# Altium footprint library ST封装.PcbLib: 1336 footprints (part 86 of 109)
Each footprint in its own frame and in the unit in brackets; x right, y up, seen from the top. Pads: shape width x height; smd on the part's side, far side on the other; paste and mask are expansions set on the pad; w line width, h text height; cw(c..) or ccw(c..) is an arc to the next point about the centre after c.
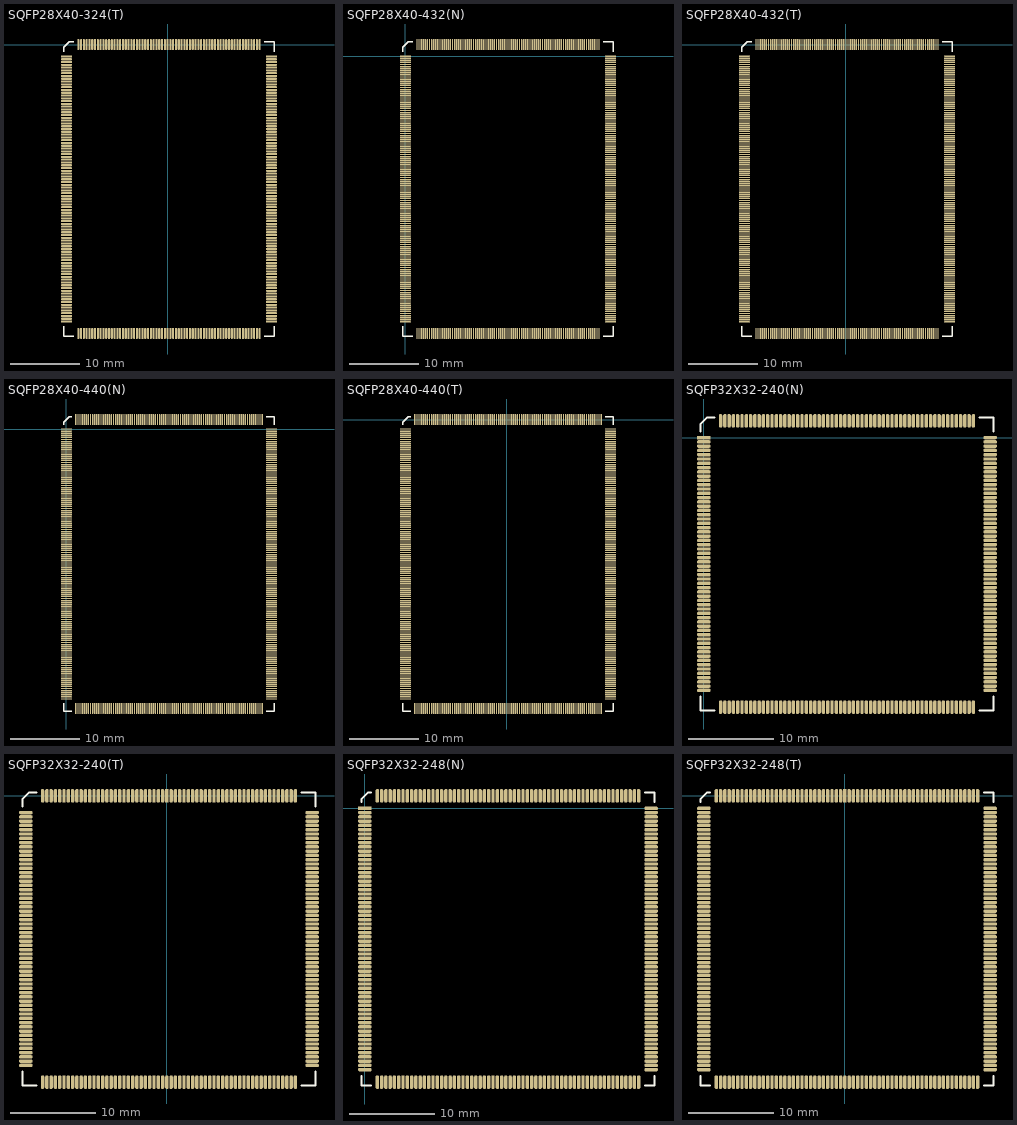
[diagram p85: the footprints below, top view; thin cyan lines are the x and y axes]

## SQFP28X40-324(T) [mm]
pads (324):
  rect 0.3x1.6 smd: 1(0,0)
  oval 0.3x1.6 smd: 2(-0.4,0) 3(-0.8,0) 4(-1.2,0) 5(-1.6,0) 6(-2,0) 7(-2.4,0) 8(-2.8,0) 9(-3.2,0) 10(-3.6,0) 11(-4,0) 12(-4.4,0) 13(-4.8,0) 14(-5.2,0) 15(-5.6,0) 16(-6,0) 17(-6.4,0) 18(-6.8,0) 19(-7.2,0) 20(-7.6,0) 21(-8,0) 22(-8.4,0) 23(-8.8,0) 24(-9.2,0) 25(-9.6,0) 26(-10,0) 27(-10.4,0) 28(-10.8,0) 29(-11.2,0) 30(-11.6,0) 31(-12,0) 32(-12.4,0) 33(-12.8,0) 130(-12.8,-41.4) 131(-12.4,-41.4) 132(-12,-41.4) 133(-11.6,-41.4) 134(-11.2,-41.4) 135(-10.8,-41.4) 136(-10.4,-41.4) 137(-10,-41.4) 138(-9.6,-41.4) 139(-9.2,-41.4) 140(-8.8,-41.4) 141(-8.4,-41.4) 142(-8,-41.4) 143(-7.6,-41.4) 144(-7.2,-41.4) 145(-6.8,-41.4) 146(-6.4,-41.4) 147(-6,-41.4) 148(-5.6,-41.4) 149(-5.2,-41.4) 150(-4.8,-41.4) 151(-4.4,-41.4) 152(-4,-41.4) 153(-3.6,-41.4) 154(-3.2,-41.4) 155(-2.8,-41.4) 156(-2.4,-41.4) 157(-2,-41.4) 158(-1.6,-41.4) 159(-1.2,-41.4) 160(-0.8,-41.4) 161(-0.4,-41.4) 162(0,-41.4) 163(0.4,-41.4) 164(0.8,-41.4) 165(1.2,-41.4) 166(1.6,-41.4) 167(2,-41.4) 168(2.4,-41.4) 169(2.8,-41.4) 170(3.2,-41.4) 171(3.6,-41.4) 172(4,-41.4) 173(4.4,-41.4) 174(4.8,-41.4) 175(5.2,-41.4) 176(5.6,-41.4) 177(6,-41.4) 178(6.4,-41.4) 179(6.8,-41.4) 180(7.2,-41.4) 181(7.6,-41.4) 182(8,-41.4) 183(8.4,-41.4) 184(8.8,-41.4) 185(9.2,-41.4) 186(9.6,-41.4) 187(10,-41.4) 188(10.4,-41.4) 189(10.8,-41.4) 190(11.2,-41.4) 191(11.6,-41.4) 192(12,-41.4) 193(12.4,-41.4) 194(12.8,-41.4) 195(13.2,-41.4) 292(13.2,0) 293(12.8,0) 294(12.4,0) 295(12,0) 296(11.6,0) 297(11.2,0) 298(10.8,0) 299(10.4,0) 300(10,0) 301(9.6,0) 302(9.2,0) 303(8.8,0) 304(8.4,0) 305(8,0) 306(7.6,0) 307(7.2,0) 308(6.8,0) 309(6.4,0) 310(6,0) 311(5.6,0) 312(5.2,0) 313(4.8,0) 314(4.4,0) 315(4,0) 316(3.6,0) 317(3.2,0) 318(2.8,0) 319(2.4,0) 320(2,0) 321(1.6,0) 322(1.2,0) 323(0.8,0) 324(0.4,0)
  oval 1.6x0.3 smd: 34(-14.5,-1.7) 35(-14.5,-2.1) 36(-14.5,-2.5) 37(-14.5,-2.9) 38(-14.5,-3.3) 39(-14.5,-3.7) 40(-14.5,-4.1) 41(-14.5,-4.5) 42(-14.5,-4.9) 43(-14.5,-5.3) 44(-14.5,-5.7) 45(-14.5,-6.1) 46(-14.5,-6.5) 47(-14.5,-6.9) 48(-14.5,-7.3) 49(-14.5,-7.7) 50(-14.5,-8.1) 51(-14.5,-8.5) 52(-14.5,-8.9) 53(-14.5,-9.3) 54(-14.5,-9.7) 55(-14.5,-10.1) 56(-14.5,-10.5) 57(-14.5,-10.9) 58(-14.5,-11.3) 59(-14.5,-11.7) 60(-14.5,-12.1) 61(-14.5,-12.5) 62(-14.5,-12.9) 63(-14.5,-13.3) 64(-14.5,-13.7) 65(-14.5,-14.1) 66(-14.5,-14.5) 67(-14.5,-14.9) 68(-14.5,-15.3) 69(-14.5,-15.7) 70(-14.5,-16.1) 71(-14.5,-16.5) 72(-14.5,-16.9) 73(-14.5,-17.3) 74(-14.5,-17.7) 75(-14.5,-18.1) 76(-14.5,-18.5) 77(-14.5,-18.9) 78(-14.5,-19.3) 79(-14.5,-19.7) 80(-14.5,-20.1) 81(-14.5,-20.5) 82(-14.5,-20.9) 83(-14.5,-21.3) 84(-14.5,-21.7) 85(-14.5,-22.1) 86(-14.5,-22.5) 87(-14.5,-22.9) 88(-14.5,-23.3) 89(-14.5,-23.7) 90(-14.5,-24.1) 91(-14.5,-24.5) 92(-14.5,-24.9) 93(-14.5,-25.3) 94(-14.5,-25.7) 95(-14.5,-26.1) 96(-14.5,-26.5) 97(-14.5,-26.9) 98(-14.5,-27.3) 99(-14.5,-27.7) 100(-14.5,-28.1) 101(-14.5,-28.5) 102(-14.5,-28.9) 103(-14.5,-29.3) 104(-14.5,-29.7) 105(-14.5,-30.1) 106(-14.5,-30.5) 107(-14.5,-30.9) 108(-14.5,-31.3) 109(-14.5,-31.7) 110(-14.5,-32.1) 111(-14.5,-32.5) 112(-14.5,-32.9) 113(-14.5,-33.3) 114(-14.5,-33.7) 115(-14.5,-34.1) 116(-14.5,-34.5) 117(-14.5,-34.9) 118(-14.5,-35.3) 119(-14.5,-35.7) 120(-14.5,-36.1) 121(-14.5,-36.5) 122(-14.5,-36.9) 123(-14.5,-37.3) 124(-14.5,-37.7) 125(-14.5,-38.1) 126(-14.5,-38.5) 127(-14.5,-38.9) 128(-14.5,-39.3) 129(-14.5,-39.7) 196(14.9,-39.7) 197(14.9,-39.3) 198(14.9,-38.9) 199(14.9,-38.5) 200(14.9,-38.1) 201(14.9,-37.7) 202(14.9,-37.3) 203(14.9,-36.9) 204(14.9,-36.5) 205(14.9,-36.1) 206(14.9,-35.7) 207(14.9,-35.3) 208(14.9,-34.9) 209(14.9,-34.5) 210(14.9,-34.1) 211(14.9,-33.7) 212(14.9,-33.3) 213(14.9,-32.9) 214(14.9,-32.5) 215(14.9,-32.1) 216(14.9,-31.7) 217(14.9,-31.3) 218(14.9,-30.9) 219(14.9,-30.5) 220(14.9,-30.1) 221(14.9,-29.7) 222(14.9,-29.3) 223(14.9,-28.9) 224(14.9,-28.5) 225(14.9,-28.1) 226(14.9,-27.7) 227(14.9,-27.3) 228(14.9,-26.9) 229(14.9,-26.5) 230(14.9,-26.1) 231(14.9,-25.7) 232(14.9,-25.3) 233(14.9,-24.9) 234(14.9,-24.5) 235(14.9,-24.1) 236(14.9,-23.7) 237(14.9,-23.3) 238(14.9,-22.9) 239(14.9,-22.5) 240(14.9,-22.1) 241(14.9,-21.7) 242(14.9,-21.3) 243(14.9,-20.9) 244(14.9,-20.5) 245(14.9,-20.1) 246(14.9,-19.7) 247(14.9,-19.3) 248(14.9,-18.9) 249(14.9,-18.5) 250(14.9,-18.1) 251(14.9,-17.7) 252(14.9,-17.3) 253(14.9,-16.9) 254(14.9,-16.5) 255(14.9,-16.1) 256(14.9,-15.7) 257(14.9,-15.3) 258(14.9,-14.9) 259(14.9,-14.5) 260(14.9,-14.1) 261(14.9,-13.7) 262(14.9,-13.3) 263(14.9,-12.9) 264(14.9,-12.5) 265(14.9,-12.1) 266(14.9,-11.7) 267(14.9,-11.3) 268(14.9,-10.9) 269(14.9,-10.5) 270(14.9,-10.1) 271(14.9,-9.7) 272(14.9,-9.3) 273(14.9,-8.9) 274(14.9,-8.5) 275(14.9,-8.1) 276(14.9,-7.7) 277(14.9,-7.3) 278(14.9,-6.9) 279(14.9,-6.5) 280(14.9,-6.1) 281(14.9,-5.7) 282(14.9,-5.3) 283(14.9,-4.9) 284(14.9,-4.5) 285(14.9,-4.1) 286(14.9,-3.7) 287(14.9,-3.3) 288(14.9,-2.9) 289(14.9,-2.5) 290(14.9,-2.1) 291(14.9,-1.7)
Top Overlay:
  lines w0.2: -14.9,-40.35 -14.9,-41.8 -13.45,-41.8 ; -14.9,-1.05 -14.9,-0.4 -14.1,0.4 -13.45,0.4 ; 13.85,-41.8 15.3,-41.8 15.3,-40.35 ; 13.85,0.4 15.3,0.4 15.3,-1.05

## SQFP28X40-432(N) [mm]
pads (432):
  rect 1.6x0.2 smd: 1(0,0)
  oval 1.6x0.2 smd: 2(0,-0.3) 3(0,-0.6) 4(0,-0.9) 5(0,-1.2) 6(0,-1.5) 7(0,-1.8) 8(0,-2.1) 9(0,-2.4) 10(0,-2.7) 11(0,-3) 12(0,-3.3) 13(0,-3.6) 14(0,-3.9) 15(0,-4.2) 16(0,-4.5) 17(0,-4.8) 18(0,-5.1) 19(0,-5.4) 20(0,-5.7) 21(0,-6) 22(0,-6.3) 23(0,-6.6) 24(0,-6.9) 25(0,-7.2) 26(0,-7.5) 27(0,-7.8) 28(0,-8.1) 29(0,-8.4) 30(0,-8.7) 31(0,-9) 32(0,-9.3) 33(0,-9.6) 34(0,-9.9) 35(0,-10.2) 36(0,-10.5) 37(0,-10.8) 38(0,-11.1) 39(0,-11.4) 40(0,-11.7) 41(0,-12) 42(0,-12.3) 43(0,-12.6) 44(0,-12.9) 45(0,-13.2) 46(0,-13.5) 47(0,-13.8) 48(0,-14.1) 49(0,-14.4) 50(0,-14.7) 51(0,-15) 52(0,-15.3) 53(0,-15.6) 54(0,-15.9) 55(0,-16.2) 56(0,-16.5) 57(0,-16.8) 58(0,-17.1) 59(0,-17.4) 60(0,-17.7) 61(0,-18) 62(0,-18.3) 63(0,-18.6) 64(0,-18.9) 65(0,-19.2) 66(0,-19.5) 67(0,-19.8) 68(0,-20.1) 69(0,-20.4) 70(0,-20.7) 71(0,-21) 72(0,-21.3) 73(0,-21.6) 74(0,-21.9) 75(0,-22.2) 76(0,-22.5) 77(0,-22.8) 78(0,-23.1) 79(0,-23.4) 80(0,-23.7) 81(0,-24) 82(0,-24.3) 83(0,-24.6) 84(0,-24.9) 85(0,-25.2) 86(0,-25.5) 87(0,-25.8) 88(0,-26.1) 89(0,-26.4) 90(0,-26.7) 91(0,-27) 92(0,-27.3) 93(0,-27.6) 94(0,-27.9) 95(0,-28.2) 96(0,-28.5) 97(0,-28.8) 98(0,-29.1) 99(0,-29.4) 100(0,-29.7) 101(0,-30) 102(0,-30.3) 103(0,-30.6) 104(0,-30.9) 105(0,-31.2) 106(0,-31.5) 107(0,-31.8) 108(0,-32.1) 109(0,-32.4) 110(0,-32.7) 111(0,-33) 112(0,-33.3) 113(0,-33.6) 114(0,-33.9) 115(0,-34.2) 116(0,-34.5) 117(0,-34.8) 118(0,-35.1) 119(0,-35.4) 120(0,-35.7) 121(0,-36) 122(0,-36.3) 123(0,-36.6) 124(0,-36.9) 125(0,-37.2) 126(0,-37.5) 127(0,-37.8) 128(0,-38.1) 217(29.4,-38.1) 218(29.4,-37.8) 219(29.4,-37.5) 220(29.4,-37.2) 221(29.4,-36.9) 222(29.4,-36.6) 223(29.4,-36.3) 224(29.4,-36) 225(29.4,-35.7) 226(29.4,-35.4) 227(29.4,-35.1) 228(29.4,-34.8) 229(29.4,-34.5) 230(29.4,-34.2) 231(29.4,-33.9) 232(29.4,-33.6) 233(29.4,-33.3) 234(29.4,-33) 235(29.4,-32.7) 236(29.4,-32.4) 237(29.4,-32.1) 238(29.4,-31.8) 239(29.4,-31.5) 240(29.4,-31.2) 241(29.4,-30.9) 242(29.4,-30.6) 243(29.4,-30.3) 244(29.4,-30) 245(29.4,-29.7) 246(29.4,-29.4) 247(29.4,-29.1) 248(29.4,-28.8) 249(29.4,-28.5) 250(29.4,-28.2) 251(29.4,-27.9) 252(29.4,-27.6) 253(29.4,-27.3) 254(29.4,-27) 255(29.4,-26.7) 256(29.4,-26.4) 257(29.4,-26.1) 258(29.4,-25.8) 259(29.4,-25.5) 260(29.4,-25.2) 261(29.4,-24.9) 262(29.4,-24.6) 263(29.4,-24.3) 264(29.4,-24) 265(29.4,-23.7) 266(29.4,-23.4) 267(29.4,-23.1) 268(29.4,-22.8) 269(29.4,-22.5) 270(29.4,-22.2) 271(29.4,-21.9) 272(29.4,-21.6) 273(29.4,-21.3) 274(29.4,-21) 275(29.4,-20.7) 276(29.4,-20.4) 277(29.4,-20.1) 278(29.4,-19.8) 279(29.4,-19.5) 280(29.4,-19.2) 281(29.4,-18.9) 282(29.4,-18.6) 283(29.4,-18.3) 284(29.4,-18) 285(29.4,-17.7) 286(29.4,-17.4) 287(29.4,-17.1) 288(29.4,-16.8) 289(29.4,-16.5) 290(29.4,-16.2) 291(29.4,-15.9) 292(29.4,-15.6) 293(29.4,-15.3) 294(29.4,-15) 295(29.4,-14.7) 296(29.4,-14.4) 297(29.4,-14.1) 298(29.4,-13.8) 299(29.4,-13.5) 300(29.4,-13.2) 301(29.4,-12.9) 302(29.4,-12.6) 303(29.4,-12.3) 304(29.4,-12) 305(29.4,-11.7) 306(29.4,-11.4) 307(29.4,-11.1) 308(29.4,-10.8) 309(29.4,-10.5) 310(29.4,-10.2) 311(29.4,-9.9) 312(29.4,-9.6) 313(29.4,-9.3) 314(29.4,-9) 315(29.4,-8.7) 316(29.4,-8.4) 317(29.4,-8.1) 318(29.4,-7.8) 319(29.4,-7.5) 320(29.4,-7.2) 321(29.4,-6.9) 322(29.4,-6.6) 323(29.4,-6.3) 324(29.4,-6) 325(29.4,-5.7) 326(29.4,-5.4) 327(29.4,-5.1) 328(29.4,-4.8) 329(29.4,-4.5) 330(29.4,-4.2) 331(29.4,-3.9) 332(29.4,-3.6) 333(29.4,-3.3) 334(29.4,-3) 335(29.4,-2.7) 336(29.4,-2.4) 337(29.4,-2.1) 338(29.4,-1.8) 339(29.4,-1.5) 340(29.4,-1.2) 341(29.4,-0.9) 342(29.4,-0.6) 343(29.4,-0.3) 344(29.4,0)
  oval 0.2x1.6 smd: 129(1.65,-39.75) 130(1.95,-39.75) 131(2.25,-39.75) 132(2.55,-39.75) 133(2.85,-39.75) 134(3.15,-39.75) 135(3.45,-39.75) 136(3.75,-39.75) 137(4.05,-39.75) 138(4.35,-39.75) 139(4.65,-39.75) 140(4.95,-39.75) 141(5.25,-39.75) 142(5.55,-39.75) 143(5.85,-39.75) 144(6.15,-39.75) 145(6.45,-39.75) 146(6.75,-39.75) 147(7.05,-39.75) 148(7.35,-39.75) 149(7.65,-39.75) 150(7.95,-39.75) 151(8.25,-39.75) 152(8.55,-39.75) 153(8.85,-39.75) 154(9.15,-39.75) 155(9.45,-39.75) 156(9.75,-39.75) 157(10.05,-39.75) 158(10.35,-39.75) 159(10.65,-39.75) 160(10.95,-39.75) 161(11.25,-39.75) 162(11.55,-39.75) 163(11.85,-39.75) 164(12.15,-39.75) 165(12.45,-39.75) 166(12.75,-39.75) 167(13.05,-39.75) 168(13.35,-39.75) 169(13.65,-39.75) 170(13.95,-39.75) 171(14.25,-39.75) 172(14.55,-39.75) 173(14.85,-39.75) 174(15.15,-39.75) 175(15.45,-39.75) 176(15.75,-39.75) 177(16.05,-39.75) 178(16.35,-39.75) 179(16.65,-39.75) 180(16.95,-39.75) 181(17.25,-39.75) 182(17.55,-39.75) 183(17.85,-39.75) 184(18.15,-39.75) 185(18.45,-39.75) 186(18.75,-39.75) 187(19.05,-39.75) 188(19.35,-39.75) 189(19.65,-39.75) 190(19.95,-39.75) 191(20.25,-39.75) 192(20.55,-39.75) 193(20.85,-39.75) 194(21.15,-39.75) 195(21.45,-39.75) 196(21.75,-39.75) 197(22.05,-39.75) 198(22.35,-39.75) 199(22.65,-39.75) 200(22.95,-39.75) 201(23.25,-39.75) 202(23.55,-39.75) 203(23.85,-39.75) 204(24.15,-39.75) 205(24.45,-39.75) 206(24.75,-39.75) 207(25.05,-39.75) 208(25.35,-39.75) 209(25.65,-39.75) 210(25.95,-39.75) 211(26.25,-39.75) 212(26.55,-39.75) 213(26.85,-39.75) 214(27.15,-39.75) 215(27.45,-39.75) 216(27.75,-39.75) 345(27.75,1.65) 346(27.45,1.65) 347(27.15,1.65) 348(26.85,1.65) 349(26.55,1.65) 350(26.25,1.65) 351(25.95,1.65) 352(25.65,1.65) 353(25.35,1.65) 354(25.05,1.65) 355(24.75,1.65) 356(24.45,1.65) 357(24.15,1.65) 358(23.85,1.65) 359(23.55,1.65) 360(23.25,1.65) 361(22.95,1.65) 362(22.65,1.65) 363(22.35,1.65) 364(22.05,1.65) 365(21.75,1.65) 366(21.45,1.65) 367(21.15,1.65) 368(20.85,1.65) 369(20.55,1.65) 370(20.25,1.65) 371(19.95,1.65) 372(19.65,1.65) 373(19.35,1.65) 374(19.05,1.65) 375(18.75,1.65) 376(18.45,1.65) 377(18.15,1.65) 378(17.85,1.65) 379(17.55,1.65) 380(17.25,1.65) 381(16.95,1.65) 382(16.65,1.65) 383(16.35,1.65) 384(16.05,1.65) 385(15.75,1.65) 386(15.45,1.65) 387(15.15,1.65) 388(14.85,1.65) 389(14.55,1.65) 390(14.25,1.65) 391(13.95,1.65) 392(13.65,1.65) 393(13.35,1.65) 394(13.05,1.65) 395(12.75,1.65) 396(12.45,1.65) 397(12.15,1.65) 398(11.85,1.65) 399(11.55,1.65) 400(11.25,1.65) 401(10.95,1.65) 402(10.65,1.65) 403(10.35,1.65) 404(10.05,1.65) 405(9.75,1.65) 406(9.45,1.65) 407(9.15,1.65) 408(8.85,1.65) 409(8.55,1.65) 410(8.25,1.65) 411(7.95,1.65) 412(7.65,1.65) 413(7.35,1.65) 414(7.05,1.65) 415(6.75,1.65) 416(6.45,1.65) 417(6.15,1.65) 418(5.85,1.65) 419(5.55,1.65) 420(5.25,1.65) 421(4.95,1.65) 422(4.65,1.65) 423(4.35,1.65) 424(4.05,1.65) 425(3.75,1.65) 426(3.45,1.65) 427(3.15,1.65) 428(2.85,1.65) 429(2.55,1.65) 430(2.25,1.65) 431(1.95,1.65) 432(1.65,1.65)
Top Overlay:
  lines w0.2: -0.4,-38.7 -0.4,-40.15 1.05,-40.15 ; -0.4,0.6 -0.4,1.25 0.4,2.05 1.05,2.05 ; 28.35,-40.15 29.8,-40.15 29.8,-38.7 ; 28.35,2.05 29.8,2.05 29.8,0.6

## SQFP28X40-432(T) [mm]
pads (432):
  rect 0.2x1.6 smd: 1(0,0)
  oval 0.2x1.6 smd: 2(-0.3,0) 3(-0.6,0) 4(-0.9,0) 5(-1.2,0) 6(-1.5,0) 7(-1.8,0) 8(-2.1,0) 9(-2.4,0) 10(-2.7,0) 11(-3,0) 12(-3.3,0) 13(-3.6,0) 14(-3.9,0) 15(-4.2,0) 16(-4.5,0) 17(-4.8,0) 18(-5.1,0) 19(-5.4,0) 20(-5.7,0) 21(-6,0) 22(-6.3,0) 23(-6.6,0) 24(-6.9,0) 25(-7.2,0) 26(-7.5,0) 27(-7.8,0) 28(-8.1,0) 29(-8.4,0) 30(-8.7,0) 31(-9,0) 32(-9.3,0) 33(-9.6,0) 34(-9.9,0) 35(-10.2,0) 36(-10.5,0) 37(-10.8,0) 38(-11.1,0) 39(-11.4,0) 40(-11.7,0) 41(-12,0) 42(-12.3,0) 43(-12.6,0) 44(-12.9,0) 173(-12.9,-41.4) 174(-12.6,-41.4) 175(-12.3,-41.4) 176(-12,-41.4) 177(-11.7,-41.4) 178(-11.4,-41.4) 179(-11.1,-41.4) 180(-10.8,-41.4) 181(-10.5,-41.4) 182(-10.2,-41.4) 183(-9.9,-41.4) 184(-9.6,-41.4) 185(-9.3,-41.4) 186(-9,-41.4) 187(-8.7,-41.4) 188(-8.4,-41.4) 189(-8.1,-41.4) 190(-7.8,-41.4) 191(-7.5,-41.4) 192(-7.2,-41.4) 193(-6.9,-41.4) 194(-6.6,-41.4) 195(-6.3,-41.4) 196(-6,-41.4) 197(-5.7,-41.4) 198(-5.4,-41.4) 199(-5.1,-41.4) 200(-4.8,-41.4) 201(-4.5,-41.4) 202(-4.2,-41.4) 203(-3.9,-41.4) 204(-3.6,-41.4) 205(-3.3,-41.4) 206(-3,-41.4) 207(-2.7,-41.4) 208(-2.4,-41.4) 209(-2.1,-41.4) 210(-1.8,-41.4) 211(-1.5,-41.4) 212(-1.2,-41.4) 213(-0.9,-41.4) 214(-0.6,-41.4) 215(-0.3,-41.4) 216(0,-41.4) 217(0.3,-41.4) 218(0.6,-41.4) 219(0.9,-41.4) 220(1.2,-41.4) 221(1.5,-41.4) 222(1.8,-41.4) 223(2.1,-41.4) 224(2.4,-41.4) 225(2.7,-41.4) 226(3,-41.4) 227(3.3,-41.4) 228(3.6,-41.4) 229(3.9,-41.4) 230(4.2,-41.4) 231(4.5,-41.4) 232(4.8,-41.4) 233(5.1,-41.4) 234(5.4,-41.4) 235(5.7,-41.4) 236(6,-41.4) 237(6.3,-41.4) 238(6.6,-41.4) 239(6.9,-41.4) 240(7.2,-41.4) 241(7.5,-41.4) 242(7.8,-41.4) 243(8.1,-41.4) 244(8.4,-41.4) 245(8.7,-41.4) 246(9,-41.4) 247(9.3,-41.4) 248(9.6,-41.4) 249(9.9,-41.4) 250(10.2,-41.4) 251(10.5,-41.4) 252(10.8,-41.4) 253(11.1,-41.4) 254(11.4,-41.4) 255(11.7,-41.4) 256(12,-41.4) 257(12.3,-41.4) 258(12.6,-41.4) 259(12.9,-41.4) 260(13.2,-41.4) 389(13.2,0) 390(12.9,0) 391(12.6,0) 392(12.3,0) 393(12,0) 394(11.7,0) 395(11.4,0) 396(11.1,0) 397(10.8,0) 398(10.5,0) 399(10.2,0) 400(9.9,0) 401(9.6,0) 402(9.3,0) 403(9,0) 404(8.7,0) 405(8.4,0) 406(8.1,0) 407(7.8,0) 408(7.5,0) 409(7.2,0) 410(6.9,0) 411(6.6,0) 412(6.3,0) 413(6,0) 414(5.7,0) 415(5.4,0) 416(5.1,0) 417(4.8,0) 418(4.5,0) 419(4.2,0) 420(3.9,0) 421(3.6,0) 422(3.3,0) 423(3,0) 424(2.7,0) 425(2.4,0) 426(2.1,0) 427(1.8,0) 428(1.5,0) 429(1.2,0) 430(0.9,0) 431(0.6,0) 432(0.3,0)
  oval 1.6x0.2 smd: 45(-14.55,-1.65) 46(-14.55,-1.95) 47(-14.55,-2.25) 48(-14.55,-2.55) 49(-14.55,-2.85) 50(-14.55,-3.15) 51(-14.55,-3.45) 52(-14.55,-3.75) 53(-14.55,-4.05) 54(-14.55,-4.35) 55(-14.55,-4.65) 56(-14.55,-4.95) 57(-14.55,-5.25) 58(-14.55,-5.55) 59(-14.55,-5.85) 60(-14.55,-6.15) 61(-14.55,-6.45) 62(-14.55,-6.75) 63(-14.55,-7.05) 64(-14.55,-7.35) 65(-14.55,-7.65) 66(-14.55,-7.95) 67(-14.55,-8.25) 68(-14.55,-8.55) 69(-14.55,-8.85) 70(-14.55,-9.15) 71(-14.55,-9.45) 72(-14.55,-9.75) 73(-14.55,-10.05) 74(-14.55,-10.35) 75(-14.55,-10.65) 76(-14.55,-10.95) 77(-14.55,-11.25) 78(-14.55,-11.55) 79(-14.55,-11.85) 80(-14.55,-12.15) 81(-14.55,-12.45) 82(-14.55,-12.75) 83(-14.55,-13.05) 84(-14.55,-13.35) 85(-14.55,-13.65) 86(-14.55,-13.95) 87(-14.55,-14.25) 88(-14.55,-14.55) 89(-14.55,-14.85) 90(-14.55,-15.15) 91(-14.55,-15.45) 92(-14.55,-15.75) 93(-14.55,-16.05) 94(-14.55,-16.35) 95(-14.55,-16.65) 96(-14.55,-16.95) 97(-14.55,-17.25) 98(-14.55,-17.55) 99(-14.55,-17.85) 100(-14.55,-18.15) 101(-14.55,-18.45) 102(-14.55,-18.75) 103(-14.55,-19.05) 104(-14.55,-19.35) 105(-14.55,-19.65) 106(-14.55,-19.95) 107(-14.55,-20.25) 108(-14.55,-20.55) 109(-14.55,-20.85) 110(-14.55,-21.15) 111(-14.55,-21.45) 112(-14.55,-21.75) 113(-14.55,-22.05) 114(-14.55,-22.35) 115(-14.55,-22.65) 116(-14.55,-22.95) 117(-14.55,-23.25) 118(-14.55,-23.55) 119(-14.55,-23.85) 120(-14.55,-24.15) 121(-14.55,-24.45) 122(-14.55,-24.75) 123(-14.55,-25.05) 124(-14.55,-25.35) 125(-14.55,-25.65) 126(-14.55,-25.95) 127(-14.55,-26.25) 128(-14.55,-26.55) 129(-14.55,-26.85) 130(-14.55,-27.15) 131(-14.55,-27.45) 132(-14.55,-27.75) 133(-14.55,-28.05) 134(-14.55,-28.35) 135(-14.55,-28.65) 136(-14.55,-28.95) 137(-14.55,-29.25) 138(-14.55,-29.55) 139(-14.55,-29.85) 140(-14.55,-30.15) 141(-14.55,-30.45) 142(-14.55,-30.75) 143(-14.55,-31.05) 144(-14.55,-31.35) 145(-14.55,-31.65) 146(-14.55,-31.95) 147(-14.55,-32.25) 148(-14.55,-32.55) 149(-14.55,-32.85) 150(-14.55,-33.15) 151(-14.55,-33.45) 152(-14.55,-33.75) 153(-14.55,-34.05) 154(-14.55,-34.35) 155(-14.55,-34.65) 156(-14.55,-34.95) 157(-14.55,-35.25) 158(-14.55,-35.55) 159(-14.55,-35.85) 160(-14.55,-36.15) 161(-14.55,-36.45) 162(-14.55,-36.75) 163(-14.55,-37.05) 164(-14.55,-37.35) 165(-14.55,-37.65) 166(-14.55,-37.95) 167(-14.55,-38.25) 168(-14.55,-38.55) 169(-14.55,-38.85) 170(-14.55,-39.15) 171(-14.55,-39.45) 172(-14.55,-39.75) 261(14.85,-39.75) 262(14.85,-39.45) 263(14.85,-39.15) 264(14.85,-38.85) 265(14.85,-38.55) 266(14.85,-38.25) 267(14.85,-37.95) 268(14.85,-37.65) 269(14.85,-37.35) 270(14.85,-37.05) 271(14.85,-36.75) 272(14.85,-36.45) 273(14.85,-36.15) 274(14.85,-35.85) 275(14.85,-35.55) 276(14.85,-35.25) 277(14.85,-34.95) 278(14.85,-34.65) 279(14.85,-34.35) 280(14.85,-34.05) 281(14.85,-33.75) 282(14.85,-33.45) 283(14.85,-33.15) 284(14.85,-32.85) 285(14.85,-32.55) 286(14.85,-32.25) 287(14.85,-31.95) 288(14.85,-31.65) 289(14.85,-31.35) 290(14.85,-31.05) 291(14.85,-30.75) 292(14.85,-30.45) 293(14.85,-30.15) 294(14.85,-29.85) 295(14.85,-29.55) 296(14.85,-29.25) 297(14.85,-28.95) 298(14.85,-28.65) 299(14.85,-28.35) 300(14.85,-28.05) 301(14.85,-27.75) 302(14.85,-27.45) 303(14.85,-27.15) 304(14.85,-26.85) 305(14.85,-26.55) 306(14.85,-26.25) 307(14.85,-25.95) 308(14.85,-25.65) 309(14.85,-25.35) 310(14.85,-25.05) 311(14.85,-24.75) 312(14.85,-24.45) 313(14.85,-24.15) 314(14.85,-23.85) 315(14.85,-23.55) 316(14.85,-23.25) 317(14.85,-22.95) 318(14.85,-22.65) 319(14.85,-22.35) 320(14.85,-22.05) 321(14.85,-21.75) 322(14.85,-21.45) 323(14.85,-21.15) 324(14.85,-20.85) 325(14.85,-20.55) 326(14.85,-20.25) 327(14.85,-19.95) 328(14.85,-19.65) 329(14.85,-19.35) 330(14.85,-19.05) 331(14.85,-18.75) 332(14.85,-18.45) 333(14.85,-18.15) 334(14.85,-17.85) 335(14.85,-17.55) 336(14.85,-17.25) 337(14.85,-16.95) 338(14.85,-16.65) 339(14.85,-16.35) 340(14.85,-16.05) 341(14.85,-15.75) 342(14.85,-15.45) 343(14.85,-15.15) 344(14.85,-14.85) 345(14.85,-14.55) 346(14.85,-14.25) 347(14.85,-13.95) 348(14.85,-13.65) 349(14.85,-13.35) 350(14.85,-13.05) 351(14.85,-12.75) 352(14.85,-12.45) 353(14.85,-12.15) 354(14.85,-11.85) 355(14.85,-11.55) 356(14.85,-11.25) 357(14.85,-10.95) 358(14.85,-10.65) 359(14.85,-10.35) 360(14.85,-10.05) 361(14.85,-9.75) 362(14.85,-9.45) 363(14.85,-9.15) 364(14.85,-8.85) 365(14.85,-8.55) 366(14.85,-8.25) 367(14.85,-7.95) 368(14.85,-7.65) 369(14.85,-7.35) 370(14.85,-7.05) 371(14.85,-6.75) 372(14.85,-6.45) 373(14.85,-6.15) 374(14.85,-5.85) 375(14.85,-5.55) 376(14.85,-5.25) 377(14.85,-4.95) 378(14.85,-4.65) 379(14.85,-4.35) 380(14.85,-4.05) 381(14.85,-3.75) 382(14.85,-3.45) 383(14.85,-3.15) 384(14.85,-2.85) 385(14.85,-2.55) 386(14.85,-2.25) 387(14.85,-1.95) 388(14.85,-1.65)
Top Overlay:
  lines w0.2: -14.95,-40.35 -14.95,-41.8 -13.5,-41.8 ; -14.95,-1.05 -14.95,-0.4 -14.15,0.4 -13.5,0.4 ; 13.8,-41.8 15.25,-41.8 15.25,-40.35 ; 13.8,0.4 15.25,0.4 15.25,-1.05

## SQFP28X40-440(N) [mm]
pads (440):
  rect 1.6x0.2 smd: 1(0,0)
  oval 1.6x0.2 smd: 2(0,-0.3) 3(0,-0.6) 4(0,-0.9) 5(0,-1.2) 6(0,-1.5) 7(0,-1.8) 8(0,-2.1) 9(0,-2.4) 10(0,-2.7) 11(0,-3) 12(0,-3.3) 13(0,-3.6) 14(0,-3.9) 15(0,-4.2) 16(0,-4.5) 17(0,-4.8) 18(0,-5.1) 19(0,-5.4) 20(0,-5.7) 21(0,-6) 22(0,-6.3) 23(0,-6.6) 24(0,-6.9) 25(0,-7.2) 26(0,-7.5) 27(0,-7.8) 28(0,-8.1) 29(0,-8.4) 30(0,-8.7) 31(0,-9) 32(0,-9.3) 33(0,-9.6) 34(0,-9.9) 35(0,-10.2) 36(0,-10.5) 37(0,-10.8) 38(0,-11.1) 39(0,-11.4) 40(0,-11.7) 41(0,-12) 42(0,-12.3) 43(0,-12.6) 44(0,-12.9) 45(0,-13.2) 46(0,-13.5) 47(0,-13.8) 48(0,-14.1) 49(0,-14.4) 50(0,-14.7) 51(0,-15) 52(0,-15.3) 53(0,-15.6) 54(0,-15.9) 55(0,-16.2) 56(0,-16.5) 57(0,-16.8) 58(0,-17.1) 59(0,-17.4) 60(0,-17.7) 61(0,-18) 62(0,-18.3) 63(0,-18.6) 64(0,-18.9) 65(0,-19.2) 66(0,-19.5) 67(0,-19.8) 68(0,-20.1) 69(0,-20.4) 70(0,-20.7) 71(0,-21) 72(0,-21.3) 73(0,-21.6) 74(0,-21.9) 75(0,-22.2) 76(0,-22.5) 77(0,-22.8) 78(0,-23.1) 79(0,-23.4) 80(0,-23.7) 81(0,-24) 82(0,-24.3) 83(0,-24.6) 84(0,-24.9) 85(0,-25.2) 86(0,-25.5) 87(0,-25.8) 88(0,-26.1) 89(0,-26.4) 90(0,-26.7) 91(0,-27) 92(0,-27.3) 93(0,-27.6) 94(0,-27.9) 95(0,-28.2) 96(0,-28.5) 97(0,-28.8) 98(0,-29.1) 99(0,-29.4) 100(0,-29.7) 101(0,-30) 102(0,-30.3) 103(0,-30.6) 104(0,-30.9) 105(0,-31.2) 106(0,-31.5) 107(0,-31.8) 108(0,-32.1) 109(0,-32.4) 110(0,-32.7) 111(0,-33) 112(0,-33.3) 113(0,-33.6) 114(0,-33.9) 115(0,-34.2) 116(0,-34.5) 117(0,-34.8) 118(0,-35.1) 119(0,-35.4) 120(0,-35.7) 121(0,-36) 122(0,-36.3) 123(0,-36.6) 124(0,-36.9) 125(0,-37.2) 126(0,-37.5) 127(0,-37.8) 128(0,-38.1) 129(0,-38.4) 130(0,-38.7) 221(29.4,-38.7) 222(29.4,-38.4) 223(29.4,-38.1) 224(29.4,-37.8) 225(29.4,-37.5) 226(29.4,-37.2) 227(29.4,-36.9) 228(29.4,-36.6) 229(29.4,-36.3) 230(29.4,-36) 231(29.4,-35.7) 232(29.4,-35.4) 233(29.4,-35.1) 234(29.4,-34.8) 235(29.4,-34.5) 236(29.4,-34.2) 237(29.4,-33.9) 238(29.4,-33.6) 239(29.4,-33.3) 240(29.4,-33) 241(29.4,-32.7) 242(29.4,-32.4) 243(29.4,-32.1) 244(29.4,-31.8) 245(29.4,-31.5) 246(29.4,-31.2) 247(29.4,-30.9) 248(29.4,-30.6) 249(29.4,-30.3) 250(29.4,-30) 251(29.4,-29.7) 252(29.4,-29.4) 253(29.4,-29.1) 254(29.4,-28.8) 255(29.4,-28.5) 256(29.4,-28.2) 257(29.4,-27.9) 258(29.4,-27.6) 259(29.4,-27.3) 260(29.4,-27) 261(29.4,-26.7) 262(29.4,-26.4) 263(29.4,-26.1) 264(29.4,-25.8) 265(29.4,-25.5) 266(29.4,-25.2) 267(29.4,-24.9) 268(29.4,-24.6) 269(29.4,-24.3) 270(29.4,-24) 271(29.4,-23.7) 272(29.4,-23.4) 273(29.4,-23.1) 274(29.4,-22.8) 275(29.4,-22.5) 276(29.4,-22.2) 277(29.4,-21.9) 278(29.4,-21.6) 279(29.4,-21.3) 280(29.4,-21) 281(29.4,-20.7) 282(29.4,-20.4) 283(29.4,-20.1) 284(29.4,-19.8) 285(29.4,-19.5) 286(29.4,-19.2) 287(29.4,-18.9) 288(29.4,-18.6) 289(29.4,-18.3) 290(29.4,-18) 291(29.4,-17.7) 292(29.4,-17.4) 293(29.4,-17.1) 294(29.4,-16.8) 295(29.4,-16.5) 296(29.4,-16.2) 297(29.4,-15.9) 298(29.4,-15.6) 299(29.4,-15.3) 300(29.4,-15) 301(29.4,-14.7) 302(29.4,-14.4) 303(29.4,-14.1) 304(29.4,-13.8) 305(29.4,-13.5) 306(29.4,-13.2) 307(29.4,-12.9) 308(29.4,-12.6) 309(29.4,-12.3) 310(29.4,-12) 311(29.4,-11.7) 312(29.4,-11.4) 313(29.4,-11.1) 314(29.4,-10.8) 315(29.4,-10.5) 316(29.4,-10.2) 317(29.4,-9.9) 318(29.4,-9.6) 319(29.4,-9.3) 320(29.4,-9) 321(29.4,-8.7) 322(29.4,-8.4) 323(29.4,-8.1) 324(29.4,-7.8) 325(29.4,-7.5) 326(29.4,-7.2) 327(29.4,-6.9) 328(29.4,-6.6) 329(29.4,-6.3) 330(29.4,-6) 331(29.4,-5.7) 332(29.4,-5.4) 333(29.4,-5.1) 334(29.4,-4.8) 335(29.4,-4.5) 336(29.4,-4.2) 337(29.4,-3.9) 338(29.4,-3.6) 339(29.4,-3.3) 340(29.4,-3) 341(29.4,-2.7) 342(29.4,-2.4) 343(29.4,-2.1) 344(29.4,-1.8) 345(29.4,-1.5) 346(29.4,-1.2) 347(29.4,-0.9) 348(29.4,-0.6) 349(29.4,-0.3) 350(29.4,0)
  oval 0.2x1.6 smd: 131(1.35,-40.05) 132(1.65,-40.05) 133(1.95,-40.05) 134(2.25,-40.05) 135(2.55,-40.05) 136(2.85,-40.05) 137(3.15,-40.05) 138(3.45,-40.05) 139(3.75,-40.05) 140(4.05,-40.05) 141(4.35,-40.05) 142(4.65,-40.05) 143(4.95,-40.05) 144(5.25,-40.05) 145(5.55,-40.05) 146(5.85,-40.05) 147(6.15,-40.05) 148(6.45,-40.05) 149(6.75,-40.05) 150(7.05,-40.05) 151(7.35,-40.05) 152(7.65,-40.05) 153(7.95,-40.05) 154(8.25,-40.05) 155(8.55,-40.05) 156(8.85,-40.05) 157(9.15,-40.05) 158(9.45,-40.05) 159(9.75,-40.05) 160(10.05,-40.05) 161(10.35,-40.05) 162(10.65,-40.05) 163(10.95,-40.05) 164(11.25,-40.05) 165(11.55,-40.05) 166(11.85,-40.05) 167(12.15,-40.05) 168(12.45,-40.05) 169(12.75,-40.05) 170(13.05,-40.05) 171(13.35,-40.05) 172(13.65,-40.05) 173(13.95,-40.05) 174(14.25,-40.05) 175(14.55,-40.05) 176(14.85,-40.05) 177(15.15,-40.05) 178(15.45,-40.05) 179(15.75,-40.05) 180(16.05,-40.05) 181(16.35,-40.05) 182(16.65,-40.05) 183(16.95,-40.05) 184(17.25,-40.05) 185(17.55,-40.05) 186(17.85,-40.05) 187(18.15,-40.05) 188(18.45,-40.05) 189(18.75,-40.05) 190(19.05,-40.05) 191(19.35,-40.05) 192(19.65,-40.05) 193(19.95,-40.05) 194(20.25,-40.05) 195(20.55,-40.05) 196(20.85,-40.05) 197(21.15,-40.05) 198(21.45,-40.05) 199(21.75,-40.05) 200(22.05,-40.05) 201(22.35,-40.05) 202(22.65,-40.05) 203(22.95,-40.05) 204(23.25,-40.05) 205(23.55,-40.05) 206(23.85,-40.05) 207(24.15,-40.05) 208(24.45,-40.05) 209(24.75,-40.05) 210(25.05,-40.05) 211(25.35,-40.05) 212(25.65,-40.05) 213(25.95,-40.05) 214(26.25,-40.05) 215(26.55,-40.05) 216(26.85,-40.05) 217(27.15,-40.05) 218(27.45,-40.05) 219(27.75,-40.05) 220(28.05,-40.05) 351(28.05,1.35) 352(27.75,1.35) 353(27.45,1.35) 354(27.15,1.35) 355(26.85,1.35) 356(26.55,1.35) 357(26.25,1.35) 358(25.95,1.35) 359(25.65,1.35) 360(25.35,1.35) 361(25.05,1.35) 362(24.75,1.35) 363(24.45,1.35) 364(24.15,1.35) 365(23.85,1.35) 366(23.55,1.35) 367(23.25,1.35) 368(22.95,1.35) 369(22.65,1.35) 370(22.35,1.35) 371(22.05,1.35) 372(21.75,1.35) 373(21.45,1.35) 374(21.15,1.35) 375(20.85,1.35) 376(20.55,1.35) 377(20.25,1.35) 378(19.95,1.35) 379(19.65,1.35) 380(19.35,1.35) 381(19.05,1.35) 382(18.75,1.35) 383(18.45,1.35) 384(18.15,1.35) 385(17.85,1.35) 386(17.55,1.35) 387(17.25,1.35) 388(16.95,1.35) 389(16.65,1.35) 390(16.35,1.35) 391(16.05,1.35) 392(15.75,1.35) 393(15.45,1.35) 394(15.15,1.35) 395(14.85,1.35) 396(14.55,1.35) 397(14.25,1.35) 398(13.95,1.35) 399(13.65,1.35) 400(13.35,1.35) 401(13.05,1.35) 402(12.75,1.35) 403(12.45,1.35) 404(12.15,1.35) 405(11.85,1.35) 406(11.55,1.35) 407(11.25,1.35) 408(10.95,1.35) 409(10.65,1.35) 410(10.35,1.35) 411(10.05,1.35) 412(9.75,1.35) 413(9.45,1.35) 414(9.15,1.35) 415(8.85,1.35) 416(8.55,1.35) 417(8.25,1.35) 418(7.95,1.35) 419(7.65,1.35) 420(7.35,1.35) 421(7.05,1.35) 422(6.75,1.35) 423(6.45,1.35) 424(6.15,1.35) 425(5.85,1.35) 426(5.55,1.35) 427(5.25,1.35) 428(4.95,1.35) 429(4.65,1.35) 430(4.35,1.35) 431(4.05,1.35) 432(3.75,1.35) 433(3.45,1.35) 434(3.15,1.35) 435(2.85,1.35) 436(2.55,1.35) 437(2.25,1.35) 438(1.95,1.35) 439(1.65,1.35) 440(1.35,1.35)